# Altium footprint library Phoenix.PcbLib: 54 footprints (part 4 of 4)
Each footprint in its own frame and in the unit in brackets; x right, y up, seen from the top. Pads: shape width x height; smd on the part's side, far side on the other; paste and mask are expansions set on the pad; w line width, h text height; cw(c..) or ccw(c..) is an arc to the next point about the centre after c.
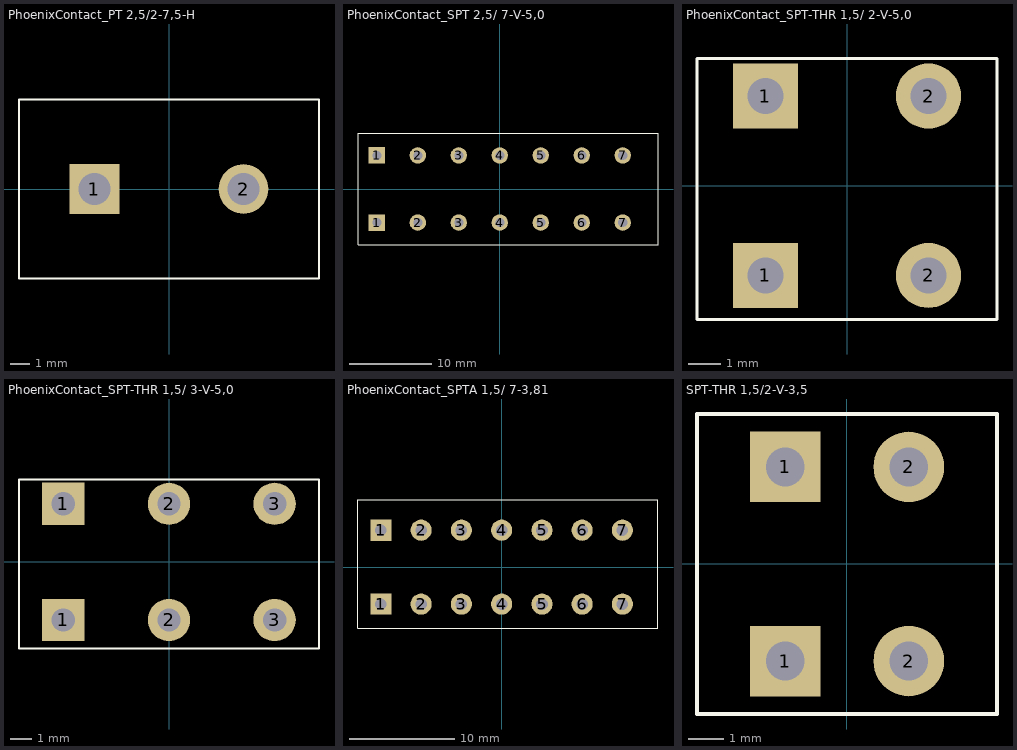
[diagram p3: the footprints below, top view; thin cyan lines are the x and y axes]

## PhoenixContact_PT 2,5/2-7,5-H [mm]
pads (2):
  rect 2.5x2.5 hole 1.6: 1(-3.75,0)
  round 2.5 hole 1.6: 2(3.75,0)
Top Overlay:
  lines w0.1: 3.55,-4.5 7.55,-4.5 7.55,4.5 3.55,4.5 ; 3.85,-4.5 -7.55,-4.5 -7.55,4.5 3.85,4.5
3D body "1988105_00.stp": height 13.51, standoff -4.09, extent -7.5,-4.5 8.391,4.5

## PhoenixContact_SPT 2,5/ 7-V-5,0 [mm] "PCB terminal block"
height 10
pads (14):
  rect 2x2 hole 1.1: 1(-15,-4.1) 1(-15,4.1)
  round 2 hole 1.1: 2(-10,-4.1) 2(-10,4.1) 3(-5,-4.1) 3(-5,4.1) 4(0,-4.1) 4(0,4.1) 5(5,-4.1) 5(5,4.1) 6(10,-4.1) 6(10,4.1) 7(15,-4.1) 7(15,4.1)
Top Overlay:
  lines w0.1: -17.3,-6.8 19.3,-6.8 19.3,6.8 -17.3,6.8 -17.3,-6.8
3D body "1991147_00.stp": height 14.41, standoff -2.59, extent -17.2,-6.75 19.2,6.75

## PhoenixContact_SPT-THR 1,5/ 2-V-5,0 [mm] "PCB terminal block"
height 10
pads (4):
  rect 2x2 hole 1.1: 1(-2.5,-2.75) 1(-2.5,2.75)
  round 2 hole 1.1: 2(2.5,-2.75) 2(2.5,2.75)
Top Overlay:
  lines w0.1: -4.6,-4.1 4.6,-4.1 4.6,3.9 -4.6,3.9 -4.6,-4.1
3D body "1823418_04.stp": height 13.63, standoff -1.99, extent -4.5,-3.95 4.5,3.75

## PhoenixContact_SPT-THR 1,5/ 3-V-5,0 [mm] "PCB terminal block"
height 10
pads (6):
  rect 2x2 hole 1.1: 1(-5,-2.75) 1(-5,2.75)
  round 2 hole 1.1: 2(0,-2.75) 2(0,2.75) 3(5,-2.75) 3(5,2.75)
Top Overlay:
  lines w0.1: -7.1,-4.1 7.1,-4.1 7.1,3.9 -7.1,3.9 -7.1,-4.1
3D body "1823421_04.stp": height 13.63, standoff -1.99, extent -7,-3.95 7,3.75

## PhoenixContact_SPTA 1,5/ 7-3,81 [mm] "PCB terminal block"
height 10
pads (14):
  rect 2x2 hole 1.1: 1(-11.43,-3.5) 1(-11.43,3.5)
  round 2 hole 1.1: 2(-7.62,-3.5) 2(-7.62,3.5) 3(-3.81,-3.5) 3(-3.81,3.5) 4(0,-3.5) 4(0,3.5) 5(3.82,-3.5) 5(3.82,3.5) 6(7.62,-3.5) 6(7.62,3.5) 7(11.43,-3.5) 7(11.43,3.5)
Top Overlay:
  lines w0.1: -13.6,-5.8 -13.6,6.4 14.8,6.4 14.8,-5.8 -13.6,-5.8
3D body "1743184_01.stp": height 12.01, standoff -3.39, extent -13.485,-5.7 14.685,6.3

## SPT-THR 1,5/2-V-3,5 [mm]
pads (4):
  rect 2x2 hole 1.1: 1(-1.75,-2.75) 1(-1.75,2.75)
  round 2 hole 1.1: 2(1.75,-2.75) 2(1.75,2.75)
Top Overlay:
  lines w0.1: -4.25,-4.25 4.25,-4.25 4.25,4.25 -4.25,4.25 -4.25,-4.25
3D body "1823191_03.stp": height 13.63, standoff -1.97, extent -3.75,-3.75 3.75,3.95